# Altium footprint library ref-packages-longpad.PCBLIB: 1527 footprints (part 35 of 103)
Each footprint in its own frame and in the unit in brackets; x right, y up, seen from the top. Pads: shape width x height; smd on the part's side, far side on the other; paste and mask are expansions set on the pad; w line width, h text height; cw(c..) or ccw(c..) is an arc to the next point about the centre after c.
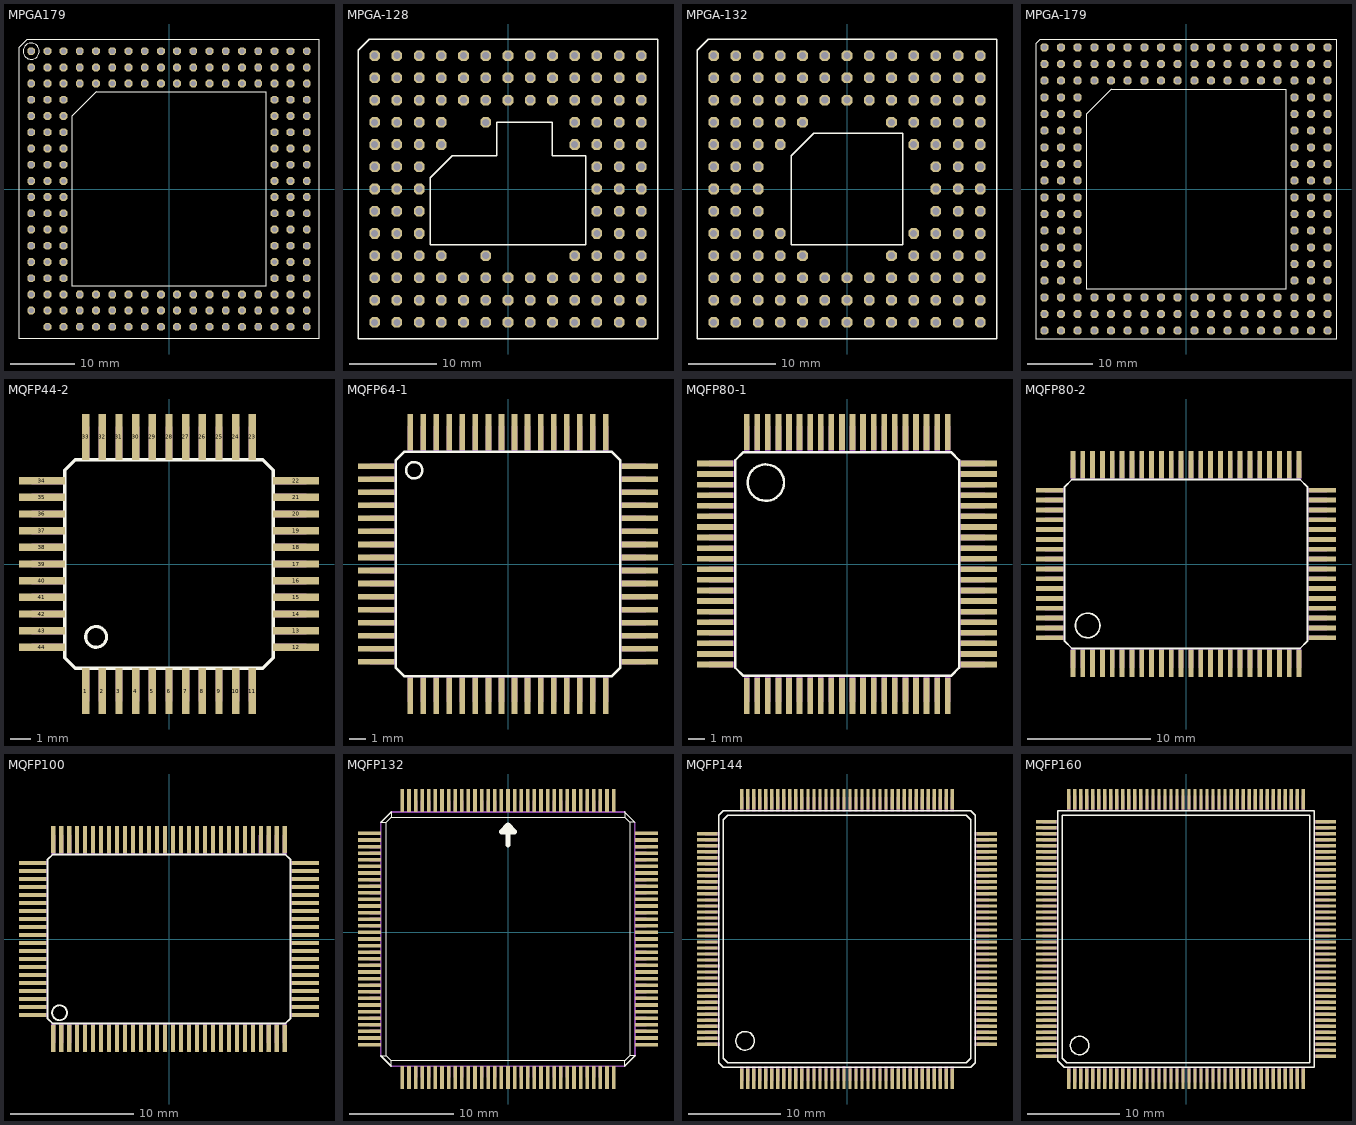
[diagram p34: the footprints below, top view; thin cyan lines are the x and y axes]

## MPGA179 [mil]
pads (179):
  oct 48x48 hole 32: A01(-850,850) A02(-750,850) A03(-650,850) A04(-550,850) A05(-450,850) A06(-350,850) A07(-250,850) A08(-150,850) A09(-50,850) A10(50,850) A11(150,850) A12(250,850) A13(350,850) A14(450,850) A15(550,850) A16(650,850) A17(750,850) A18(850,850) B01(-850,750) B02(-750,750) B03(-650,750) B04(-550,750) B05(-450,750) B06(-350,750) B07(-250,750) B08(-150,750) B09(-50,750) B10(50,750) B11(150,750) B12(250,750) B13(350,750) B14(450,750) B15(550,750) B16(650,750) B17(750,750) B18(850,750) C01(-850,650) C02(-750,650) C03(-650,650) C04(-550,650) C05(-450,650) C06(-350,650) C07(-250,650) C08(-150,650) C09(-50,650) C10(50,650) C11(150,650) C12(250,650) C13(350,650) C14(450,650) C15(550,650) C16(650,650) C17(750,650) C18(850,650) D01(-850,550) D02(-750,550) D03(-650,550) D16(650,550) D17(750,550) D18(850,550) E01(-850,450) E02(-750,450) E03(-650,450) E16(650,450) E17(750,450) E18(850,450) F01(-850,350) F02(-750,350) F03(-650,350) F16(650,350) F17(750,350) F18(850,350) G01(-850,250) G02(-750,250) G03(-650,250) G16(650,250) G17(750,250) G18(850,250) H01(-850,150) H02(-750,150) H03(-650,150) H16(650,150) H17(750,150) H18(850,150) J01(-850,50) J02(-750,50) J03(-650,50) J16(650,50) J17(750,50) J18(850,50) K01(-850,-50) K02(-750,-50) K03(-650,-50) K16(650,-50) K17(750,-50) K18(850,-50) L01(-850,-150) L02(-750,-150) L03(-650,-150) L16(650,-150) L17(750,-150) L18(850,-150) M01(-850,-250) M02(-750,-250) M03(-650,-250) M16(650,-250) M17(750,-250) M18(850,-250) N01(-850,-350) N02(-750,-350) N03(-650,-350) N16(650,-350) N17(750,-350) N18(850,-350) P01(-850,-450) P02(-750,-450) P03(-650,-450) P16(650,-450) P17(750,-450) P18(850,-450) Q01(-850,-550) Q02(-750,-550) Q03(-650,-550) Q16(650,-550) Q17(750,-550) Q18(850,-550) R01(-850,-650) R02(-750,-650) R03(-650,-650) R04(-550,-650) R05(-450,-650) R06(-350,-650) R07(-250,-650) R08(-150,-650) R09(-50,-650) R10(50,-650) R11(150,-650) R12(250,-650) R13(350,-650) R14(450,-650) R15(550,-650) R16(650,-650) R17(750,-650) R18(850,-650) S01(-850,-750) S02(-750,-750) S03(-650,-750) S04(-550,-750) S05(-450,-750) S06(-350,-750) S07(-250,-750) S08(-150,-750) S09(-50,-750) S10(50,-750) S11(150,-750) S12(250,-750) S13(350,-750) S14(450,-750) S15(550,-750) S16(650,-750) S17(750,-750) S18(850,-750) T02(-750,-850) T03(-650,-850) T04(-550,-850) T05(-450,-850) T06(-350,-850) T07(-250,-850) T08(-150,-850) T09(-50,-850) T10(50,-850) T11(150,-850) T12(250,-850) T13(350,-850) T14(450,-850) T15(550,-850) T16(650,-850) T17(750,-850) T18(850,-850)
Top Overlay:
  circle w6: c-850,850 r50
  lines w6: -925,-925 925,-925 925,925 -875,925 -925,875 -925,-925 ; -600,-600 600,-600 600,600 -450,600 -600,450 -600,-600

## MPGA-128 [mil]
pads (128):
  oct 48x48 hole 32: A01(-600,600) A02(-500,600) A03(-400,600) A04(-300,600) A05(-200,600) A06(-100,600) A07(0,600) A08(100,600) A09(200,600) A10(300,600) A11(400,600) A12(500,600) A13(600,600) B01(-600,500) B02(-500,500) B03(-400,500) B04(-300,500) B05(-200,500) B06(-100,500) B07(0,500) B08(100,500) B09(200,500) B10(300,500) B11(400,500) B12(500,500) B13(600,500) C01(-600,400) C02(-500,400) C03(-400,400) C04(-300,400) C05(-200,400) C06(-100,400) C07(0,400) C08(100,400) C09(200,400) C10(300,400) C11(400,400) C12(500,400) C13(600,400) D01(-600,300) D02(-500,300) D03(-400,300) D04(-300,300) D06(-100,300) D10(300,300) D11(400,300) D12(500,300) D13(600,300) E01(-600,200) E02(-500,200) E03(-400,200) E04(-300,200) E10(300,200) E11(400,200) E12(500,200) E13(600,200) F01(-600,100) F02(-500,100) F03(-400,100) F11(400,100) F12(500,100) F13(600,100) G01(-600,0) G02(-500,0) G03(-400,0) G11(400,0) G12(500,0) G13(600,0) H01(-600,-100) H02(-500,-100) H03(-400,-100) H11(400,-100) H12(500,-100) H13(600,-100) J01(-600,-200) J02(-500,-200) J03(-400,-200) J11(400,-200) J12(500,-200) J13(600,-200) K01(-600,-300) K02(-500,-300) K03(-400,-300) K04(-300,-300) K06(-100,-300) K10(300,-300) K11(400,-300) K12(500,-300) K13(600,-300) L01(-600,-400) L02(-500,-400) L03(-400,-400) L04(-300,-400) L05(-200,-400) L06(-100,-400) L07(0,-400) L08(100,-400) L09(200,-400) L10(300,-400) L11(400,-400) L12(500,-400) L13(600,-400) M01(-600,-500) M02(-500,-500) M03(-400,-500) M04(-300,-500) M05(-200,-500) M06(-100,-500) M07(0,-500) M08(100,-500) M09(200,-500) M10(300,-500) M11(400,-500) M12(500,-500) M13(600,-500) N01(-600,-600) N02(-500,-600) N03(-400,-600) N04(-300,-600) N05(-200,-600) N06(-100,-600) N07(0,-600) N08(100,-600) N09(200,-600) N10(300,-600) N11(400,-600) N12(500,-600) N13(600,-600)
Top Overlay:
  lines w6: -675,-675 675,-675 675,675 -625,675 -675,625 -675,-675 ; -350,-250 350,-250 350,150 200,150 200,300 -50,300 -50,150 -250,150 -350,50 -350,-250

## MPGA-132 [mil]
pads (132):
  oct 48x48 hole 32: A01(-600,600) A02(-500,600) A03(-400,600) A04(-300,600) A05(-200,600) A06(-100,600) A07(0,600) A08(100,600) A09(200,600) A10(300,600) A11(400,600) A12(500,600) A13(600,600) B01(-600,500) B02(-500,500) B03(-400,500) B04(-300,500) B05(-200,500) B06(-100,500) B07(0,500) B08(100,500) B09(200,500) B10(300,500) B11(400,500) B12(500,500) B13(600,500) C01(-600,400) C02(-500,400) C03(-400,400) C04(-300,400) C05(-200,400) C06(-100,400) C07(0,400) C08(100,400) C09(200,400) C10(300,400) C11(400,400) C12(500,400) C13(600,400) D01(-600,300) D02(-500,300) D03(-400,300) D04(-300,300) D05(-200,300) D09(200,300) D10(300,300) D11(400,300) D12(500,300) D13(600,300) E01(-600,200) E02(-500,200) E03(-400,200) E04(-300,200) E10(300,200) E11(400,200) E12(500,200) E13(600,200) F01(-600,100) F02(-500,100) F03(-400,100) F11(400,100) F12(500,100) F13(600,100) G01(-600,0) G02(-500,0) G03(-400,0) G11(400,0) G12(500,0) G13(600,0) H01(-600,-100) H02(-500,-100) H03(-400,-100) H11(400,-100) H12(500,-100) H13(600,-100) J01(-600,-200) J02(-500,-200) J03(-400,-200) J04(-300,-200) J10(300,-200) J11(400,-200) J12(500,-200) J13(600,-200) K01(-600,-300) K02(-500,-300) K03(-400,-300) K04(-300,-300) K05(-200,-300) K09(200,-300) K10(300,-300) K11(400,-300) K12(500,-300) K13(600,-300) L01(-600,-400) L02(-500,-400) L03(-400,-400) L04(-300,-400) L05(-200,-400) L06(-100,-400) L07(0,-400) L08(100,-400) L09(200,-400) L10(300,-400) L11(400,-400) L12(500,-400) L13(600,-400) M01(-600,-500) M02(-500,-500) M03(-400,-500) M04(-300,-500) M05(-200,-500) M06(-100,-500) M07(0,-500) M08(100,-500) M09(200,-500) M10(300,-500) M11(400,-500) M12(500,-500) M13(600,-500) N01(-600,-600) N02(-500,-600) N03(-400,-600) N04(-300,-600) N05(-200,-600) N06(-100,-600) N07(0,-600) N08(100,-600) N09(200,-600) N10(300,-600) N11(400,-600) N12(500,-600) N13(600,-600)
Top Overlay:
  lines w6: -675,-675 675,-675 675,675 -625,675 -675,625 -675,-675 ; -250,-250 -250,150 -150,250 250,250 250,-250 -250,-250

## MPGA-179 [mil]
pads (180):
  oct 48x48 hole 32: A01(-850,850) A02(-750,850) A03(-650,850) A04(-550,850) A05(-450,850) A06(-350,850) A07(-250,850) A08(-150,850) A09(-50,850) A10(50,850) A11(150,850) A12(250,850) A13(350,850) A14(450,850) A15(550,850) A16(650,850) A17(750,850) A18(850,850) B01(-850,750) B02(-750,750) B03(-650,750) B04(-550,750) B05(-450,750) B06(-350,750) B07(-250,750) B08(-150,750) B09(-50,750) B10(50,750) B11(150,750) B12(250,750) B13(350,750) B14(450,750) B15(550,750) B16(650,750) B17(750,750) B18(850,750) C01(-850,650) C02(-750,650) C03(-650,650) C04(-550,650) C05(-450,650) C06(-350,650) C07(-250,650) C08(-150,650) C09(-50,650) C10(50,650) C11(150,650) C12(250,650) C13(350,650) C14(450,650) C15(550,650) C16(650,650) C17(750,650) C18(850,650) D01(-850,550) D02(-750,550) D03(-650,550) D16(650,550) D17(750,550) D18(850,550) E01(-850,450) E02(-750,450) E03(-650,450) E16(650,450) E17(750,450) E18(850,450) F01(-850,350) F02(-750,350) F03(-650,350) F16(650,350) F17(750,350) F18(850,350) G01(-850,250) G02(-750,250) G03(-650,250) G16(650,250) G17(750,250) G18(850,250) H01(-850,150) H02(-750,150) H03(-650,150) H16(650,150) H17(750,150) H18(850,150) J01(-850,50) J02(-750,50) J03(-650,50) J16(650,50) J17(750,50) J18(850,50) K01(-850,-50) K02(-750,-50) K03(-650,-50) K16(650,-50) K17(750,-50) K18(850,-50) L01(-850,-150) L02(-750,-150) L03(-650,-150) L16(650,-150) L17(750,-150) L18(850,-150) M01(-850,-250) M02(-750,-250) M03(-650,-250) M16(650,-250) M17(750,-250) M18(850,-250) N01(-850,-350) N02(-750,-350) N03(-650,-350) N16(650,-350) N17(750,-350) N18(850,-350) P01(-850,-450) P02(-750,-450) P03(-650,-450) P16(650,-450) P17(750,-450) P18(850,-450) Q01(-850,-550) Q02(-750,-550) Q03(-650,-550) Q16(650,-550) Q17(750,-550) Q18(850,-550) R01(-850,-650) R02(-750,-650) R03(-650,-650) R04(-550,-650) R05(-450,-650) R06(-350,-650) R07(-250,-650) R08(-150,-650) R09(-50,-650) R10(50,-650) R11(150,-650) R12(250,-650) R13(350,-650) R14(450,-650) R15(550,-650) R16(650,-650) R17(750,-650) R18(850,-650) S01(-850,-750) S02(-750,-750) S03(-650,-750) S04(-550,-750) S05(-450,-750) S06(-350,-750) S07(-250,-750) S08(-150,-750) S09(-50,-750) S10(50,-750) S11(150,-750) S12(250,-750) S13(350,-750) S14(450,-750) S15(550,-750) S16(650,-750) S17(750,-750) S18(850,-750) T01(-850,-850) T02(-750,-850) T03(-650,-850) T04(-550,-850) T05(-450,-850) T06(-350,-850) T07(-250,-850) T08(-150,-850) T09(-50,-850) T10(50,-850) T11(150,-850) T12(250,-850) T13(350,-850) T14(450,-850) T15(550,-850) T16(650,-850) T17(750,-850) T18(850,-850)
Top Overlay:
  lines w6: -900,-900 900,-900 900,900 -875,900 -900,875 -900,-900 ; -600,-600 600,-600 600,600 -450,600 -600,450 -600,-600

## MQFP44-2 [mm]
pads (44):
  rect 0.35x2.2 smd: 1(-4,-6.1) 2(-3.2,-6.1) 3(-2.4,-6.1) 4(-1.6,-6.1) 5(-0.8,-6.1) 6(0,-6.1) 7(0.8,-6.1) 8(1.6,-6.1) 9(2.4,-6.1) 10(3.2,-6.1) 11(4,-6.1) 23(4,6.1) 24(3.2,6.1) 25(2.4,6.1) 26(1.6,6.1) 27(0.8,6.1) 28(0,6.1) 29(-0.8,6.1) 30(-1.6,6.1) 31(-2.4,6.1) 32(-3.2,6.1) 33(-4,6.1)
  rect 2.2x0.35 smd: 12(6.1,-4) 13(6.1,-3.2) 14(6.1,-2.4) 15(6.1,-1.6) 16(6.1,-0.8) 17(6.1,0) 18(6.1,0.8) 19(6.1,1.6) 20(6.1,2.4) 21(6.1,3.2) 22(6.1,4) 34(-6.1,4) 35(-6.1,3.2) 36(-6.1,2.4) 37(-6.1,1.6) 38(-6.1,0.8) 39(-6.1,0) 40(-6.1,-0.8) 41(-6.1,-1.6) 42(-6.1,-2.4) 43(-6.1,-3.2) 44(-6.1,-4)
Top Overlay:
  circle w0.152: c-3.5,-3.5 r0.5
  lines w0.152: -5,-4.5 -4.5,-5 4.5,-5 5,-4.5 5,4.5 4.5,5 -4.5,5 -5,4.5 -5,-4.5
Mechanical 16:
  rectangle: -4.175,5 -3.825,6.6
  rectangle: -3.375,5 -3.025,6.6
  rectangle: -2.575,5 -2.225,6.6
  rectangle: -1.775,5 -1.425,6.6
  rectangle: -0.975,5 -0.625,6.6
  rectangle: -0.175,5 0.175,6.6
  rectangle: 0.625,5 0.975,6.6
  rectangle: 1.425,5 1.775,6.6
  rectangle: 2.225,5 2.575,6.6
  rectangle: 3.025,5 3.375,6.6
  rectangle: 3.825,5 4.175,6.6
  rectangle: 5,3.025 6.6,3.375
  rectangle: 5,3.825 6.6,4.175
  rectangle: 5,2.225 6.6,2.575
  rectangle: 5,1.425 6.6,1.775
  rectangle: 5,0.625 6.6,0.975
  rectangle: 5,-0.175 6.6,0.175
  rectangle: 5,-0.975 6.6,-0.625
  rectangle: 5,-1.775 6.6,-1.425
  rectangle: 5,-2.575 6.6,-2.225
  rectangle: 5,-3.375 6.6,-3.025
  rectangle: 5,-4.175 6.6,-3.825
  rectangle: 3.825,-6.6 4.175,-5
  rectangle: 3.025,-6.6 3.375,-5
  rectangle: 2.225,-6.6 2.575,-5
  rectangle: 1.425,-6.6 1.775,-5
  rectangle: 0.625,-6.6 0.975,-5
  rectangle: -0.175,-6.6 0.175,-5
  rectangle: -0.975,-6.6 -0.625,-5
  rectangle: -1.775,-6.6 -1.425,-4.975
  rectangle: -2.575,-6.6 -2.225,-5
  rectangle: -3.375,-6.6 -3.025,-5
  rectangle: -4.175,-6.6 -3.825,-5
  rectangle: -6.6,-4.175 -5,-3.825
  rectangle: -6.6,-3.375 -5,-3.025
  rectangle: -6.6,-2.575 -5,-2.225
  rectangle: -6.6,-0.975 -5,-0.625
  rectangle: -6.6,-1.775 -5,-1.425
  rectangle: -6.6,0.625 -5,0.975
  rectangle: -6.6,-0.175 -5,0.175
  rectangle: -6.6,2.225 -5,2.575
  rectangle: -6.6,1.425 -5,1.775
  rectangle: -6.6,3.825 -5,4.175
  rectangle: -6.6,3.025 -5,3.375

## MQFP64-1 [mm]
pads (64):
  rect 2.2x0.35 smd: 1(-8.1,6) 2(-8.1,5.2) 3(-8.1,4.4) 4(-8.1,3.6) 5(-8.1,2.8) 6(-8.1,2) 7(-8.1,1.2) 8(-8.1,0.4) 9(-8.1,-0.4) 10(-8.1,-1.2) 11(-8.1,-2) 12(-8.1,-2.8) 13(-8.1,-3.6) 14(-8.1,-4.4) 15(-8.1,-5.2) 16(-8.1,-6) 33(8.1,-6) 34(8.1,-5.2) 35(8.1,-4.4) 36(8.1,-3.6) 37(8.1,-2.8) 38(8.1,-2) 39(8.1,-1.2) 40(8.1,-0.4) 41(8.1,0.4) 42(8.1,1.2) 43(8.1,2) 44(8.1,2.8) 45(8.1,3.6) 46(8.1,4.4) 47(8.1,5.2) 48(8.1,6)
  rect 0.35x2.2 smd: 17(-6,-8.1) 18(-5.2,-8.1) 19(-4.4,-8.1) 20(-3.6,-8.1) 21(-2.8,-8.1) 22(-2,-8.1) 23(-1.2,-8.1) 24(-0.4,-8.1) 25(0.4,-8.1) 26(1.2,-8.1) 27(2,-8.1) 28(2.8,-8.1) 29(3.6,-8.1) 30(4.4,-8.1) 31(5.2,-8.1) 32(6,-8.1) 49(6,8.1) 50(5.2,8.1) 51(4.4,8.1) 52(3.6,8.1) 53(2.8,8.1) 54(2,8.1) 55(1.2,8.1) 56(0.4,8.1) 57(-0.4,8.1) 58(-1.2,8.1) 59(-2,8.1) 60(-2.8,8.1) 61(-3.6,8.1) 62(-4.4,8.1) 63(-5.2,8.1) 64(-6,8.1)
Top Overlay:
  circle w0.152: c-5.75,5.75 r0.5
  lines w0.152: -6.873,-6.373 -6.873,6.373 -6.373,6.873 6.373,6.873 6.873,6.373 6.873,-6.373 6.373,-6.873 -6.373,-6.873 -6.873,-6.373
Mechanical 16:
  rectangle: 6.873,5.825 8.473,6.175
  rectangle: 6.873,5.025 8.473,5.375
  rectangle: 6.873,4.225 8.473,4.575
  rectangle: 6.873,3.425 8.473,3.775
  rectangle: 6.873,2.625 8.473,2.975
  rectangle: 6.873,1.825 8.473,2.175
  rectangle: 6.873,1.025 8.473,1.375
  rectangle: 6.873,0.225 8.473,0.575
  rectangle: 6.873,-0.575 8.473,-0.225
  rectangle: 6.873,-1.375 8.473,-1.025
  rectangle: 6.873,-2.175 8.473,-1.825
  rectangle: 6.873,-2.975 8.473,-2.625
  rectangle: 6.873,-3.775 8.473,-3.425
  rectangle: 6.873,-4.575 8.473,-4.225
  rectangle: 6.873,-5.375 8.473,-5.025
  rectangle: 6.873,-6.175 8.473,-5.825
  rectangle: 5.825,-8.473 6.175,-6.873
  rectangle: 5.025,-8.473 5.375,-6.873
  rectangle: 4.225,-8.473 4.575,-6.873
  rectangle: 3.425,-8.473 3.775,-6.873
  rectangle: 2.625,-8.473 2.975,-6.873
  rectangle: 1.825,-8.473 2.175,-6.873
  rectangle: 1.025,-8.473 1.375,-6.873
  rectangle: 0.225,-8.473 0.575,-6.873
  rectangle: -0.575,-8.473 -0.225,-6.873
  rectangle: -1.375,-8.473 -1.025,-6.873
  rectangle: -2.175,-8.473 -1.825,-6.873
  rectangle: -2.975,-8.473 -2.625,-6.873
  rectangle: -3.775,-8.473 -3.425,-6.873
  rectangle: -4.575,-8.473 -4.225,-6.873
  rectangle: -5.375,-8.473 -5.025,-6.873
  rectangle: -6.175,-8.473 -5.825,-6.873
  rectangle: -8.473,-6.175 -6.873,-5.825
  rectangle: -8.473,-5.375 -6.873,-5.025
  rectangle: -8.473,-4.575 -6.873,-4.225
  rectangle: -8.473,-3.775 -6.873,-3.425
  rectangle: -8.473,-2.975 -6.873,-2.625
  rectangle: -8.473,-2.175 -6.873,-1.825
  rectangle: -8.473,-1.375 -6.873,-1.025
  rectangle: -8.473,-0.575 -6.873,-0.225
  rectangle: -8.473,0.225 -6.873,0.575
  rectangle: -8.473,1.025 -6.873,1.375
  rectangle: -8.473,1.825 -6.873,2.175
  rectangle: -8.473,2.625 -6.873,2.975
  rectangle: -8.473,3.425 -6.873,3.775
  rectangle: -8.473,4.225 -6.873,4.575
  rectangle: -8.473,5.025 -6.873,5.375
  rectangle: -8.473,5.825 -6.873,6.175
  rectangle: -5.375,6.873 -5.025,8.473
  rectangle: -6.175,6.873 -5.825,8.473
  rectangle: -3.775,6.873 -3.425,8.473
  rectangle: -4.575,6.873 -4.225,8.473
  rectangle: -2.975,6.873 -2.625,8.473
  rectangle: -2.175,6.848 -1.825,8.473
  rectangle: -1.375,6.873 -1.025,8.473
  rectangle: -0.575,6.873 -0.225,8.473
  rectangle: 0.225,6.873 0.575,8.473
  rectangle: 1.025,6.873 1.375,8.473
  rectangle: 1.825,6.873 2.175,8.473
  rectangle: 2.625,6.873 2.975,8.473
  rectangle: 3.425,6.873 3.775,8.473
  rectangle: 4.225,6.873 4.575,8.473
  rectangle: 5.825,6.873 6.175,8.473
  rectangle: 5.025,6.873 5.375,8.473

## MQFP80-1 [mm]
pads (80):
  rect 2.2x0.35 smd: 1(-8.125,6.175) 2(-8.125,5.525) 3(-8.125,4.875) 4(-8.125,4.225) 5(-8.125,3.575) 6(-8.125,2.925) 7(-8.125,2.275) 8(-8.125,1.625) 9(-8.125,0.975) 10(-8.125,0.325) 11(-8.125,-0.325) 12(-8.125,-0.975) 13(-8.125,-1.625) 14(-8.125,-2.275) 15(-8.125,-2.925) 16(-8.125,-3.575) 17(-8.125,-4.225) 18(-8.125,-4.875) 19(-8.125,-5.525) 20(-8.125,-6.175) 41(8.1,-6.175) 42(8.1,-5.525) 43(8.1,-4.875) 44(8.1,-4.225) 45(8.1,-3.575) 46(8.1,-2.925) 47(8.1,-2.275) 48(8.1,-1.625) 49(8.1,-0.975) 50(8.1,-0.325) 51(8.1,0.325) 52(8.1,0.975) 53(8.1,1.625) 54(8.1,2.275) 55(8.1,2.925) 56(8.1,3.575) 57(8.1,4.225) 58(8.1,4.875) 59(8.1,5.525) 60(8.1,6.175)
  rect 0.35x2.2 smd: 21(-6.175,-8.1) 22(-5.525,-8.1) 23(-4.875,-8.1) 24(-4.225,-8.1) 25(-3.575,-8.1) 26(-2.925,-8.1) 27(-2.275,-8.1) 28(-1.625,-8.1) 29(-0.975,-8.1) 30(-0.325,-8.1) 31(0.325,-8.1) 32(0.975,-8.1) 33(1.625,-8.1) 34(2.275,-8.1) 35(2.925,-8.1) 36(3.575,-8.1) 37(4.225,-8.1) 38(4.875,-8.1) 39(5.525,-8.1) 40(6.175,-8.1) 61(6.175,8.1) 62(5.525,8.1) 63(4.875,8.1) 64(4.225,8.1) 65(3.575,8.1) 66(2.925,8.1) 67(2.275,8.1) 68(1.625,8.1) 69(0.975,8.1) 70(0.325,8.1) 71(-0.325,8.1) 72(-0.975,8.1) 73(-1.625,8.1) 74(-2.275,8.1) 75(-2.925,8.1) 76(-3.575,8.1) 77(-4.225,8.1) 78(-4.875,8.1) 79(-5.525,8.1) 80(-6.175,8.1)
Top Overlay:
  circle w0.152: c-5,5 r1.118
  lines w0.152: -6.873,-6.373 -6.873,6.373 -6.373,6.873 6.373,6.873 6.873,6.373 6.873,-6.373 6.373,-6.873 -6.373,-6.873 -6.873,-6.373
Mechanical 16:
  rectangle: 6,6.873 6.35,8.473
  rectangle: 5.35,6.873 5.7,8.473
  rectangle: 4.7,6.873 5.05,8.473
  rectangle: 4.05,6.873 4.4,8.473
  rectangle: 3.4,6.873 3.75,8.473
  rectangle: 2.75,6.873 3.1,8.473
  rectangle: 2.1,6.873 2.45,8.473
  rectangle: 1.45,6.873 1.8,8.473
  rectangle: 0.8,6.873 1.15,8.473
  rectangle: 0.15,6.873 0.5,8.473
  rectangle: -0.5,6.873 -0.15,8.473
  rectangle: -1.15,6.873 -0.8,8.473
  rectangle: -1.8,6.873 -1.45,8.473
  rectangle: -2.45,6.873 -2.1,8.473
  rectangle: -3.1,6.873 -2.75,8.473
  rectangle: -3.75,6.873 -3.4,8.473
  rectangle: -4.4,6.873 -4.05,8.473
  rectangle: -5.05,6.873 -4.7,8.473
  rectangle: -5.7,6.873 -5.35,8.473
  rectangle: -6.35,6.873 -6,8.473
  rectangle: -8.473,6 -6.898,6.35
  rectangle: -8.473,5.35 -6.898,5.7
  rectangle: -8.473,4.05 -6.898,4.4
  rectangle: -8.473,4.7 -6.898,5.05
  rectangle: -8.473,3.4 -6.898,3.75
  rectangle: -8.473,2.75 -6.898,3.1
  rectangle: -8.473,2.1 -6.898,2.45
  rectangle: -8.473,1.45 -6.898,1.8
  rectangle: -8.473,0.8 -6.898,1.15
  rectangle: -8.473,0.15 -6.898,0.5
  rectangle: -8.473,-0.5 -6.898,-0.15
  rectangle: -8.473,-1.15 -6.898,-0.8
  rectangle: -8.473,-1.8 -6.898,-1.45
  rectangle: -8.473,-2.45 -6.898,-2.1
  rectangle: -8.473,-3.1 -6.898,-2.75
  rectangle: -8.473,-3.75 -6.898,-3.4
  rectangle: -8.473,-4.4 -6.898,-4.05
  rectangle: -8.473,-5.05 -6.898,-4.7
  rectangle: -8.473,-5.7 -6.898,-5.35
  rectangle: -8.473,-6.35 -6.898,-6
  rectangle: -6.35,-8.473 -6,-6.898
  rectangle: -5.7,-8.473 -5.35,-6.873
  rectangle: -5.05,-8.473 -4.7,-6.873
  rectangle: -4.4,-8.473 -4.05,-6.873
  rectangle: -3.75,-8.473 -3.4,-6.873
  rectangle: -3.1,-8.473 -2.75,-6.873
  rectangle: -2.45,-8.473 -2.1,-6.873
  rectangle: -1.8,-8.473 -1.45,-6.873
  rectangle: -1.15,-8.473 -0.8,-6.873
  rectangle: -0.5,-8.473 -0.15,-6.873
  rectangle: 0.15,-8.473 0.5,-6.873
  rectangle: 0.8,-8.473 1.15,-6.873
  rectangle: 1.45,-8.473 1.8,-6.873
  rectangle: 2.1,-8.473 2.45,-6.873
  rectangle: 2.75,-8.473 3.1,-6.873
  rectangle: 3.4,-8.473 3.75,-6.873
  rectangle: 4.05,-8.473 4.4,-6.873
  rectangle: 4.7,-8.473 5.05,-6.873
  rectangle: 5.35,-8.473 5.7,-6.873
  rectangle: 6,-8.473 6.35,-6.873
  rectangle: 6.873,6 8.473,6.35
  rectangle: 6.873,5.35 8.473,5.7
  rectangle: 6.873,4.7 8.473,5.05
  rectangle: 6.873,4.05 8.473,4.4
  rectangle: 6.873,3.4 8.473,3.75
  rectangle: 6.873,2.75 8.473,3.1
  rectangle: 6.873,2.1 8.473,2.45
  rectangle: 6.873,1.45 8.473,1.8
  rectangle: 6.873,0.8 8.473,1.15
  rectangle: 6.873,0.15 8.473,0.5
  rectangle: 6.873,-0.5 8.473,-0.15
  rectangle: 6.873,-1.15 8.473,-0.8
  rectangle: 6.873,-1.8 8.473,-1.45
  rectangle: 6.873,-2.45 8.473,-2.1
  rectangle: 6.873,-3.1 8.473,-2.75
  rectangle: 6.873,-3.75 8.473,-3.4
  rectangle: 6.873,-4.4 8.473,-4.05
  rectangle: 6.873,-5.05 8.473,-4.7
  rectangle: 6.873,-5.7 8.473,-5.35
  rectangle: 6.873,-6.35 8.473,-6

## MQFP80-2 [mm]
pads (80):
  rect 0.4x2.2 smd: 1(-9.2,-8.1) 2(-8.4,-8.1) 3(-7.6,-8.1) 4(-6.8,-8.1) 5(-6,-8.1) 6(-5.2,-8.1) 7(-4.4,-8.1) 8(-3.6,-8.1) 9(-2.8,-8.1) 10(-2,-8.1) 11(-1.2,-8.1) 12(-0.4,-8.1) 13(0.4,-8.1) 14(1.2,-8.1) 15(2,-8.1) 16(2.8,-8.1) 17(3.6,-8.1) 18(4.4,-8.1) 19(5.2,-8.1) 20(6,-8.1) 21(6.8,-8.1) 22(7.6,-8.1) 23(8.4,-8.1) 24(9.2,-8.1) 41(9.2,8.1) 42(8.4,8.1) 43(7.6,8.1) 44(6.8,8.1) 45(6,8.1) 46(5.2,8.1) 47(4.4,8.1) 48(3.6,8.1) 49(2.8,8.1) 50(2,8.1) 51(1.2,8.1) 52(0.4,8.1) 53(-0.4,8.1) 54(-1.2,8.1) 55(-2,8.1) 56(-2.8,8.1) 57(-3.6,8.1) 58(-4.4,8.1) 59(-5.2,8.1) 60(-6,8.1) 61(-6.8,8.1) 62(-7.6,8.1) 63(-8.4,8.1) 64(-9.2,8.1)
  rect 2.2x0.4 smd: 25(11.1,-6) 26(11.1,-5.2) 27(11.1,-4.4) 28(11.1,-3.6) 29(11.1,-2.8) 30(11.1,-2) 31(11.1,-1.2) 32(11.1,-0.4) 33(11.1,0.4) 34(11.1,1.2) 35(11.1,2) 36(11.1,2.8) 37(11.1,3.6) 38(11.1,4.4) 39(11.1,5.2) 40(11.1,6) 65(-11.1,6) 66(-11.1,5.2) 67(-11.1,4.4) 68(-11.1,3.6) 69(-11.1,2.8) 70(-11.1,2) 71(-11.1,1.2) 72(-11.1,0.4) 73(-11.1,-0.4) 74(-11.1,-1.2) 75(-11.1,-2) 76(-11.1,-2.8) 77(-11.1,-3.6) 78(-11.1,-4.4) 79(-11.1,-5.2) 80(-11.1,-6)
Top Overlay:
  circle w0.152: c-8,-5 r1
  lines w0.152: -9.873,-6.273 -9.873,6.273 -9.273,6.873 9.273,6.873 9.873,6.273 9.873,-6.273 9.273,-6.873 -9.273,-6.873 -9.873,-6.273
Mechanical 16:
  rectangle: -9.4,6.873 -9,8.473
  rectangle: -8.6,6.873 -8.2,8.473
  rectangle: -7.8,6.873 -7.4,8.473
  rectangle: -7,6.873 -6.6,8.473
  rectangle: -6.2,6.873 -5.8,8.473
  rectangle: -5.4,6.873 -5,8.473
  rectangle: -4.6,6.873 -4.2,8.473
  rectangle: -3.8,6.873 -3.4,8.473
  rectangle: -3,6.873 -2.6,8.473
  rectangle: -2.2,6.873 -1.8,8.473
  rectangle: -1.4,6.873 -1,8.473
  rectangle: -0.6,6.873 -0.2,8.473
  rectangle: 0.2,6.873 0.6,8.473
  rectangle: 1,6.873 1.4,8.473
  rectangle: 1.8,6.873 2.2,8.473
  rectangle: 2.6,6.873 3,8.473
  rectangle: 3.4,6.873 3.8,8.473
  rectangle: 4.2,6.873 4.6,8.473
  rectangle: 5,6.873 5.4,8.473
  rectangle: 5.8,6.873 6.2,8.473
  rectangle: 6.6,6.873 7,8.473
  rectangle: 7.4,6.873 7.8,8.473
  rectangle: 8.2,6.873 8.6,8.473
  rectangle: 9,6.873 9.4,8.473
  rectangle: -9.4,-8.473 -9,-6.873
  rectangle: -8.6,-8.473 -8.2,-6.873
  rectangle: -7.8,-8.473 -7.4,-6.873
  rectangle: -7,-8.473 -6.6,-6.873
  rectangle: -6.2,-8.473 -5.8,-6.873
  rectangle: -5.4,-8.473 -5,-6.873
  rectangle: -4.6,-8.473 -4.2,-6.873
  rectangle: -3.8,-8.473 -3.4,-6.873
  rectangle: -3,-8.473 -2.6,-6.873
  rectangle: -2.2,-8.473 -1.8,-6.873
  rectangle: -1.4,-8.473 -1,-6.873
  rectangle: -0.6,-8.473 -0.2,-6.873
  rectangle: 0.2,-8.473 0.6,-6.873
  rectangle: 1,-8.473 1.4,-6.873
  rectangle: 1.8,-8.473 2.2,-6.873
  rectangle: 2.6,-8.473 3,-6.873
  rectangle: 3.4,-8.473 3.8,-6.873
  rectangle: 4.2,-8.473 4.6,-6.873
  rectangle: 5,-8.473 5.4,-6.873
  rectangle: 5.8,-8.473 6.2,-6.873
  rectangle: 6.6,-8.473 7,-6.873
  rectangle: 7.4,-8.473 7.8,-6.873
  rectangle: 8.2,-8.473 8.6,-6.873
  rectangle: 9,-8.473 9.4,-6.873
  rectangle: -11.473,5.8 -9.873,6.2
  rectangle: -11.473,5 -9.873,5.4
  rectangle: -11.473,4.2 -9.873,4.6
  rectangle: -11.473,3.4 -9.873,3.8
  rectangle: -11.473,2.6 -9.873,3
  rectangle: -11.473,1.8 -9.873,2.2
  rectangle: -11.473,1 -9.873,1.4
  rectangle: -11.473,0.2 -9.873,0.6